# Altium footprint library ADNB95C.PcbLib: 249 footprints (part 12 of 16)
Each footprint in its own frame and in the unit in brackets; x right, y up, seen from the top. Pads: shape width x height; smd on the part's side, far side on the other; paste and mask are expansions set on the pad; w line width, h text height; cw(c..) or ccw(c..) is an arc to the next point about the centre after c.
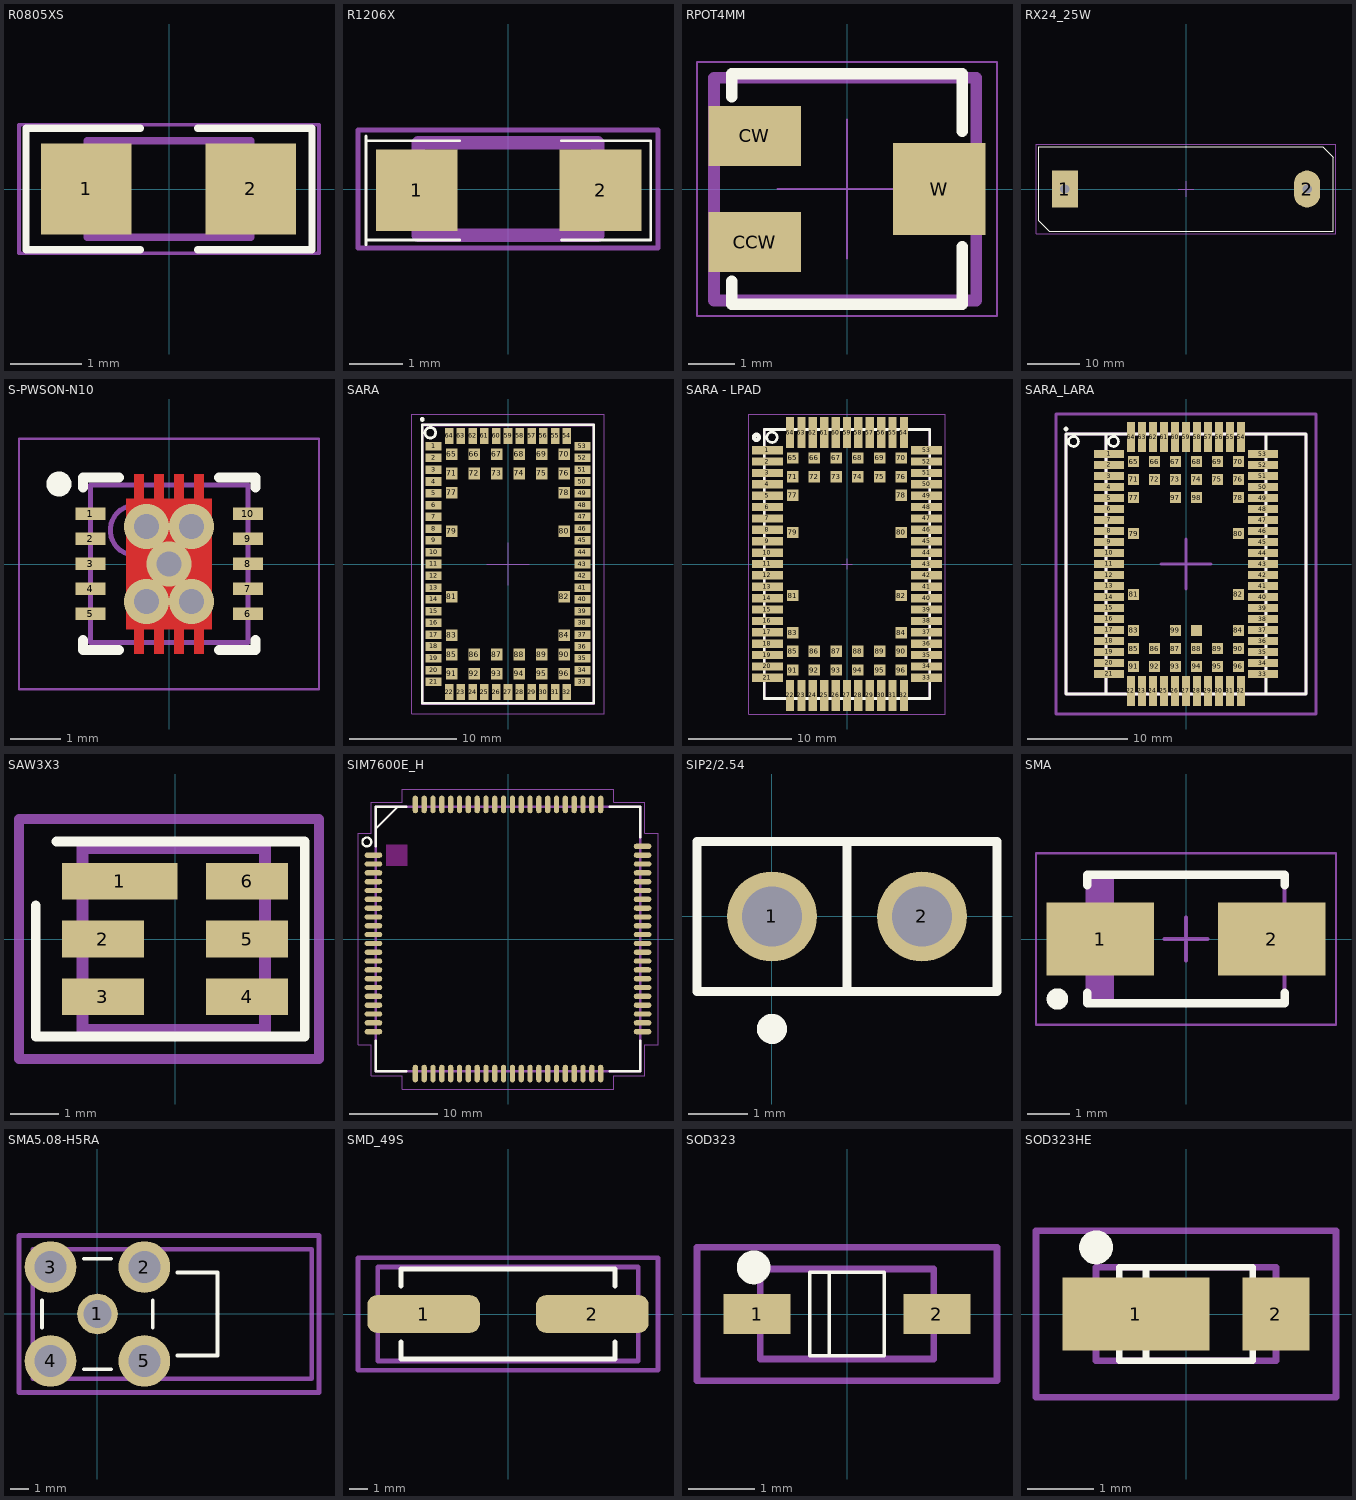
[diagram p11: the footprints below, top view; thin cyan lines are the x and y axes]

## R0805XS [mil] "Chip Resistor;"
height 23.62
pads (2):
  rect 50x50 smd: 1(-45.55,0) 2(45,0)
Top Overlay:
  lines w3.94: -15.75,-33.47 -78.74,-33.47 -78.74,33.46 -15.75,33.46 ; 15.75,-33.47 78.74,-33.47 78.74,33.46 15.75,33.46
Top Designator (Mech7):
  text ".Designator" at -149.95,-10 h30
Top Assembly:
  lines w3.94: -45.28,-26.58 45.28,-26.58 45.28,26.58 -45.28,26.58 -45.28,-26.58
Top Courtyard:
  lines w1.97: -82.68,-35.43 82.68,-35.43 82.68,35.43 -82.68,35.43 -82.68,-35.43
3D body "User Library-RES_2013-0805.STEP": height 29.92, standoff 0, extent -45.28,-26.58 45.27,26.57

## R1206X [mil] "Chip Resistor;"
height 23.62
pads (2):
  rect 60x60 smd: 1(-67,-1) 2(68,-1)
Top Overlay:
  lines w2: -104.33,-41 -104.33,39 ; -104.33,-37.4 -35.43,-37.4 ; -104.33,35.44 -35.43,35.44 ; 39.37,-37.4 105,-37.4 105,35.44 39.37,35.44
Top Designator (Mech7):
  text ".Designator" at -299.9,-19.99 h60
Top Assembly:
  lines w10: -65.94,-34.05 -65.94,34.06 65.95,34.06 65.95,-34.05 -65.94,-34.05
Top Courtyard:
  lines w3.94: -110.24,-43.31 -110.24,43.31 110.24,43.31 110.24,-43.31 -110.24,-43.31
3D body "User Library-RES_3216-1206.STEP": height 33.46, standoff 0, extent -65.94,-34.05 65.95,34.06

## RPOT4MM [mm] "Square Trimming Potentiometer"
height 6
pads (3):
  rect 2x1.3 smd: CCW(-2,-1.15) CW(-2,1.15)
  rect 2x2 smd: W(2,0)
Top Overlay:
  lines w0.254: -2.5,-2 -2.5,-2.5 2.5,-2.5 2.5,-1.25 ; -2.5,2 -2.5,2.5 2.5,2.5 2.5,1.25
Top Designator (Mech7):
  text ".Designator" at -6.094,-0.406 h1.22
Top Assembly:
  lines w0.254: -2.881,-2.418 2.803,-2.418 2.803,2.408 -2.881,2.408 -2.881,-2.418
Top Courtyard:
  lines w0.05: -1.5,0 1.5,0 ; 0,-1.5 0,1.5 ; -3.25,-2.75 -3.25,2.75 3.25,2.75 3.25,-2.75 -3.25,-2.75
3D body "3224x-1-103e.stp": height 5.3, standoff 0.01, extent -2.881,-2.418 2.803,2.408

## RX24_25W [mm] "RX24 25W Power Resistor"
pads (2):
  rect 5x7 hole 1.8: 1(-23,0)
  oval 5x7 hole 1.8: 2(23,0)
Top Overlay:
  lines w0.15: -28,-6 -26,-8 28,-8 28,6 26,8 -28,8 -28,-6
Top Designator (Mech7):
  text ".Designator" at -7.618,-0.508 h1.52
Top Courtyard:
  lines w0.2: -1.5,0 1.5,0 ; 0,-1.5 0,1.5 ; -28.5,-8.5 28.5,-8.5 28.5,8.5 -28.5,8.5 -28.5,-8.5

## S-PWSON-N10 [mm] "QFN, 10-Leads, Body 3.00x3.00mm, Pitch 0.50mm, Thermal Pad 1.70x2.15mm, IPC Medium Density"
height 0.8
pads (11):
  round 0.025 smd: 0(0,0)
  rect 0.6x0.25 smd mask+0.076: 1(-1.575,1) 2(-1.575,0.5) 3(-1.575,0) 4(-1.575,-0.5) 5(-1.575,-1) 6(1.575,-1) 7(1.575,-0.5) 8(1.575,0) 9(1.575,0.5) 10(1.575,1)
via 0,0 diameter 0.9 hole 0.508
via -0.45,-0.75 diameter 0.9 hole 0.508
via 0.45,-0.75 diameter 0.9 hole 0.508
via 0.45,0.75 diameter 0.9 hole 0.508
via -0.45,0.75 diameter 0.9 hole 0.508
Top Layer:
  region: 0.302,1.8 0.098,1.8 0.098,1.2 0.302,1.2
  region: 0.702,1.8 0.498,1.8 0.498,1.2 0.702,1.2
  rectangle: -0.302,1.2 -0.098,1.8
  rectangle: -0.702,1.2 -0.498,1.8
  rectangle: -0.302,-1.8 -0.098,-1.2
  rectangle: -0.702,-1.8 -0.498,-1.2
  region: 0.302,-1.2 0.098,-1.2 0.098,-1.8 0.302,-1.8
  region: 0.702,-1.2 0.498,-1.2 0.498,-1.8 0.702,-1.8
  region: -0.85,-1.3 -0.85,1.3 0.85,1.3 0.85,-1.3
Top Overlay:
  circle w0.25: c-2.2,1.6 r0.125
  lines w0.2: -1.725,-1.525 -1.725,-1.725 -1,-1.725 ; -1.725,1.525 -1.725,1.725 -1,1.725 ; 1,-1.725 1.725,-1.725 1.725,-1.525 ; 1,1.725 1.725,1.725 1.725,1.525
Top Designator (Mech7):
  text ".Designator" at -6.094,-0.406 h1.22
Top Assembly:
  circle w0.1: c-0.675,0.675 r0.5
  lines w0.1: -1.575,-1.575 -1.575,1.575 1.575,1.575 1.575,-1.575 -1.575,-1.575
Top Courtyard:
  lines w0.05: -3,-2.5 -3,2.5 3,2.5 3,-2.5 -3,-2.5
  lines w0.1: -0.5,0 0.5,0 ; 0,-0.5 0,0.5
3D body "S-PWSON-N10.step": height 0.8, standoff 0, extent -1.625,-1.575 1.625,1.575

## SARA [mm] "SARA UBLOX MODULE"
height 2.53
pads (96):
  rect 1.5x0.8 smd: 1(-6.95,11) 2(-6.95,9.9) 3(-6.95,8.8) 4(-6.95,7.7) 5(-6.95,6.6) 6(-6.95,5.5) 7(-6.95,4.4) 8(-6.95,3.3) 9(-6.95,2.2) 10(-6.95,1.1) 11(-6.95,0) 12(-6.95,-1.1) 13(-6.95,-2.2) 14(-6.95,-3.3) 15(-6.95,-4.4) 16(-6.95,-5.5) 17(-6.95,-6.6) 18(-6.95,-7.7) 19(-6.95,-8.8) 20(-6.95,-9.9) 21(-6.95,-11) 33(6.95,-11) 34(6.95,-9.9) 35(6.95,-8.8) 36(6.95,-7.7) 37(6.95,-6.6) 38(6.95,-5.5) 39(6.95,-4.4) 40(6.95,-3.3) 41(6.95,-2.2) 42(6.95,-1.1) 43(6.95,0) 44(6.95,1.1) 45(6.95,2.2) 46(6.95,3.3) 47(6.95,4.4) 48(6.95,5.5) 49(6.95,6.6) 50(6.95,7.7) 51(6.95,8.8) 52(6.95,9.9) 53(6.95,11)
  rect 0.8x1.5 smd: 22(-5.5,-11.95) 23(-4.4,-11.95) 24(-3.3,-11.95) 25(-2.2,-11.95) 26(-1.1,-11.95) 27(0,-11.95) 28(1.1,-11.95) 29(2.2,-11.95) 30(3.3,-11.95) 31(4.4,-11.95) 32(5.5,-11.95) 54(5.5,11.95) 55(4.4,11.95) 56(3.3,11.95) 57(2.2,11.95) 58(1.1,11.95) 59(0,11.95) 60(-1.1,11.95) 61(-2.2,11.95) 62(-3.3,11.95) 63(-4.4,11.95) 64(-5.5,11.95)
  rect 1.1x1.1 smd: 65(-5.25,10.25) 66(-3.15,10.25) 67(-1.05,10.25) 68(1.05,10.25) 69(3.15,10.25) 70(5.25,10.25) 71(-5.25,8.45) 72(-3.15,8.45) 73(-1.05,8.45) 74(1.05,8.45) 75(3.15,8.45) 76(5.25,8.45) 77(-5.25,6.65) 78(5.25,6.65) 79(-5.25,3.05) 80(5.25,3.05) 81(-5.25,-3.05) 82(5.25,-3.05) 83(-5.25,-6.65) 84(5.25,-6.65) 85(-5.25,-8.45) 86(-3.15,-8.45) 87(-1.05,-8.45) 88(1.05,-8.45) 89(3.15,-8.45) 90(5.25,-8.45) 91(-5.25,-10.25) 92(-3.15,-10.25) 93(-1.05,-10.25) 94(1.05,-10.25) 95(3.15,-10.25) 96(5.25,-10.25)
Top Overlay:
  circle w0.254: c-8,13.5 r0.1
  circle w0.254: c-7.25,12.25 r0.5
  lines w0.254: -8,-13 -8,13 8,13 8,-13 -8,-13
Top Designator (Mech7):
  text ".Designator" at -7.618,-0.508 h1.52
Top Assembly:
  lines w0.254: -8.008,-13.019 7.992,-13.019 7.992,12.981 -8.008,12.981 -8.008,-13.019
Top Courtyard:
  lines w0.05: -2,0 2,0 ; 0,-2 0,2 ; -9,-14 9,-14 9,14 -9,14 -9,-14
3D body "SARA.STEP": height 2.96, standoff -0.04, extent -8.008,-13.019 7.992,12.981

## SARA - LPAD [mm] "SARA UBLOX MODULE"
height 2.53
pads (96):
  rect 3x0.8 smd paste-0.025 mask+0.076: 1(-7.7,11) 2(-7.7,9.9) 3(-7.7,8.8) 4(-7.7,7.7) 5(-7.7,6.6) 6(-7.7,5.5) 7(-7.7,4.4) 8(-7.7,3.3) 9(-7.7,2.2) 10(-7.7,1.1) 11(-7.7,0) 12(-7.7,-1.1) 13(-7.7,-2.2) 14(-7.7,-3.3) 15(-7.7,-4.4) 16(-7.7,-5.5) 17(-7.7,-6.6) 18(-7.7,-7.7) 19(-7.7,-8.8) 20(-7.7,-9.9) 21(-7.7,-11) 33(7.7,-11) 34(7.7,-9.9) 35(7.7,-8.8) 36(7.7,-7.7) 37(7.7,-6.6) 38(7.7,-5.5) 39(7.7,-4.4) 40(7.7,-3.3) 41(7.7,-2.2) 42(7.7,-1.1) 43(7.7,0) 44(7.7,1.1) 45(7.7,2.2) 46(7.7,3.3) 47(7.7,4.4) 48(7.7,5.5) 49(7.7,6.6) 50(7.7,7.7) 51(7.7,8.8) 52(7.7,9.9) 53(7.7,11)
  rect 0.8x3 smd paste-0.025 mask+0.076: 22(-5.5,-12.7) 23(-4.4,-12.7) 24(-3.3,-12.7) 25(-2.2,-12.7) 26(-1.1,-12.7) 27(0,-12.7) 28(1.1,-12.7) 29(2.2,-12.7) 30(3.3,-12.7) 31(4.4,-12.7) 32(5.5,-12.7) 54(5.5,12.7) 55(4.4,12.7) 56(3.3,12.7) 57(2.2,12.7) 58(1.1,12.7) 59(0,12.7) 60(-1.1,12.7) 61(-2.2,12.7) 62(-3.3,12.7) 63(-4.4,12.7) 64(-5.5,12.7)
  rect 1.1x1.1 smd paste-0.025 mask+0.076: 65(-5.25,10.25) 66(-3.15,10.25) 67(-1.05,10.25) 68(1.05,10.25) 69(3.15,10.25) 70(5.25,10.25) 71(-5.25,8.45) 72(-3.15,8.45) 73(-1.05,8.45) 74(1.05,8.45) 75(3.15,8.45) 76(5.25,8.45) 77(-5.25,6.65) 78(5.25,6.65) 79(-5.25,3.05) 80(5.25,3.05) 81(-5.25,-3.05) 82(5.25,-3.05) 83(-5.25,-6.65) 84(5.25,-6.65) 85(-5.25,-8.45) 86(-3.15,-8.45) 87(-1.05,-8.45) 88(1.05,-8.45) 89(3.15,-8.45) 90(5.25,-8.45) 91(-5.25,-10.25) 92(-3.15,-10.25) 93(-1.05,-10.25) 94(1.05,-10.25) 95(3.15,-10.25) 96(5.25,-10.25)
Top Overlay:
  circle w0.381: c-8.75,12.25 r0.254
  circle w0.254: c-7.25,12.25 r0.5
  lines w0.254: -8,-13 -8,13 8,13 8,-13 -8,-13
Top Designator (Mech7):
  text ".Designator" at -7.618,-0.508 h1.52
Top Assembly:
  lines w0.254: -8,-13.019 -8,12.973 ; -8,13 7.973,13 7.992,12.981 7.992,-13.011 -7.992,-13.011
Top Courtyard:
  lines w0.1: -0.5,0 0.5,0 ; 0,-0.5 0,0.5 ; -9.5,-14.5 -9.5,14.5 9.5,14.5 9.5,-14.5 -9.5,-14.5
3D body "SARA.STEP": height 2.96, standoff -0.04, extent -8.008,-13.019 7.992,12.981

## SARA_LARA [mm] "SARA UBLOX MODULE"
height 2.53
pads (100):
  rect 3x0.8 smd: 1(-7.7,11) 2(-7.7,9.9) 3(-7.7,8.8) 4(-7.7,7.7) 5(-7.7,6.6) 6(-7.7,5.5) 7(-7.7,4.4) 8(-7.7,3.3) 9(-7.7,2.2) 10(-7.7,1.1) 11(-7.7,0) 12(-7.7,-1.1) 13(-7.7,-2.2) 14(-7.7,-3.3) 15(-7.7,-4.4) 16(-7.7,-5.5) 17(-7.7,-6.6) 18(-7.7,-7.7) 19(-7.7,-8.8) 20(-7.7,-9.9) 21(-7.7,-11) 33(7.7,-11) 34(7.7,-9.9) 35(7.7,-8.8) 36(7.7,-7.7) 37(7.7,-6.6) 38(7.7,-5.5) 39(7.7,-4.4) 40(7.7,-3.3) 41(7.7,-2.2) 42(7.7,-1.1) 43(7.7,0) 44(7.7,1.1) 45(7.7,2.2) 46(7.7,3.3) 47(7.7,4.4) 48(7.7,5.5) 49(7.7,6.6) 50(7.7,7.7) 51(7.7,8.8) 52(7.7,9.9) 53(7.7,11)
  rect 0.8x3 smd: 22(-5.5,-12.7) 23(-4.4,-12.7) 24(-3.3,-12.7) 25(-2.2,-12.7) 26(-1.1,-12.7) 27(0,-12.7) 28(1.1,-12.7) 29(2.2,-12.7) 30(3.3,-12.7) 31(4.4,-12.7) 32(5.5,-12.7) 54(5.5,12.7) 55(4.4,12.7) 56(3.3,12.7) 57(2.2,12.7) 58(1.1,12.7) 59(0,12.7) 60(-1.1,12.7) 61(-2.2,12.7) 62(-3.3,12.7) 63(-4.4,12.7) 64(-5.5,12.7)
  rect 1.1x1.1 smd: 65(-5.25,10.25) 66(-3.15,10.25) 67(-1.05,10.25) 68(1.05,10.25) 69(3.15,10.25) 70(5.25,10.25) 71(-5.25,8.45) 72(-3.15,8.45) 73(-1.05,8.45) 74(1.05,8.45) 75(3.15,8.45) 76(5.25,8.45) 77(-5.25,6.65) 78(5.25,6.65) 79(-5.25,3.05) 80(5.25,3.05) 81(-5.25,-3.05) 82(5.25,-3.05) 83(-5.25,-6.65) 84(5.25,-6.65) 85(-5.25,-8.45) 86(-3.15,-8.45) 87(-1.05,-8.45) 88(1.05,-8.45) 89(3.15,-8.45) 90(5.25,-8.45) 91(-5.25,-10.25) 92(-3.15,-10.25) 93(-1.05,-10.25) 94(1.05,-10.25) 95(3.15,-10.25) 96(5.25,-10.25) 97(-1.05,6.65) 98(1.05,6.65) 99(-1.05,-6.65) 100(1.05,-6.65)
Top Overlay:
  circle w0.254: c-11.25,12.25 r0.5
  circle w0.254: c-7.25,12.25 r0.5
  circle w0.254: c-12,13.5 r0.1
  lines w0.254: -8,-13 -12,-13 -12,13 -8,13 ; -8,-13 -8,13 ; -8,-13 8,-13 ; -8,13 8,13 ; 8,-13 12,-13 12,13 8,13 ; 8,-13 8,13
Top Designator (Mech7):
  text ".Designator" at -7.618,-0.508 h1.52
Top Assembly:
  lines w0.254: -8,-13 -8,12.992 ; 7.992,-13 7.992,13 ; -12,-13 12,-13 12,13 -12,13 -12,-13
Top Courtyard:
  lines w0.254: -2.5,0 2.5,0 ; 0,-2.5 0,2.5 ; -13,-15 13,-15 13,15 -13,15 -13,-15
3D body "SARA.STEP": height 2.96, standoff -0.04, extent -8.008,-13 7.992,13

## SAW3X3 [mm] "SAW Filter 3*3*1 mm 6-pins"
height 1
pads (6):
  rect 2.4x0.762 smd: 1(-1.15,1.2)
  rect 1.7x0.762 smd: 2(-1.5,0) 3(-1.5,-1.2) 4(1.5,-1.2) 5(1.5,0) 6(1.5,1.2)
Top Overlay:
  lines w0.2: -2.9,0.7 -2.9,-2.032 2.7,-2.032 2.7,2.032 -2.468,2.032
Top Designator (Mech7):
  text ".Designator" at -7.743,-0.508 h1.52
Top Assembly:
  lines w0.254: -1.925,-1.9 -1.925,1.9 1.875,1.9 1.875,-1.9 -1.925,-1.9
Top Courtyard:
  lines w0.2: -3.25,-2.5 3,-2.5 3,2.5 -3.25,2.5 -3.25,-2.5
3D body "User Library-QCC8B.STEP": height 1.52, standoff -0.09, extent -1.925,-1.9 1.875,1.9

## SIM7600E_H [mm] "LCC Package 87pin"
pads (87):
  oval 2x0.6 smd: 1(-15.25,9.5) 2(-15.25,8.5) 3(-15.25,7.5) 4(-15.25,6.5) 5(-15.25,5.5) 6(-15.25,4.5) 7(-15.25,3.5) 8(-15.25,2.5) 9(-15.25,1.5) 10(-15.25,0.5) 11(-15.25,-0.5) 12(-15.25,-1.5) 13(-15.25,-2.5) 14(-15.25,-3.5) 15(-15.25,-4.5) 16(-15.25,-5.5) 17(-15.25,-6.5) 18(-15.25,-7.5) 19(-15.25,-8.5) 20(-15.25,-9.5) 41(15.25,-9.5) 42(15.25,-8.5) 43(15.25,-7.5) 44(15.25,-6.5) 45(15.25,-5.5) 46(15.25,-4.5) 47(15.25,-3.5) 48(15.25,-2.5) 49(15.25,-1.5) 50(15.25,-0.5) 51(15.25,0.5) 52(15.25,1.5) 53(15.25,2.5) 54(15.25,3.5) 55(15.25,4.5) 56(15.25,5.5) 57(15.25,6.5) 58(15.25,7.5) 59(15.25,8.5) 60(15.25,9.5) 81(-15.25,-10.5) 82(15.25,-10.5) 85(15.25,10.5)
  oval 0.6x2 smd: 21(-9.5,-15.25) 22(-8.5,-15.25) 23(-7.5,-15.25) 24(-6.5,-15.25) 25(-5.5,-15.25) 26(-4.5,-15.25) 27(-3.5,-15.25) 28(-2.5,-15.25) 29(-1.5,-15.25) 30(-0.5,-15.25) 31(0.5,-15.25) 32(1.5,-15.25) 33(2.5,-15.25) 34(3.5,-15.25) 35(4.5,-15.25) 36(5.5,-15.25) 37(6.5,-15.25) 38(7.5,-15.25) 39(8.5,-15.25) 40(9.5,-15.25) 61(9.5,15.25) 62(8.5,15.25) 63(7.5,15.25) 64(6.5,15.25) 65(5.5,15.25) 66(4.5,15.25) 67(3.5,15.25) 68(2.5,15.25) 69(1.5,15.25) 70(0.5,15.25) 71(-0.5,15.25) 72(-1.5,15.25) 73(-2.5,15.25) 74(-3.5,15.25) 75(-4.5,15.25) 76(-5.5,15.25) 77(-6.5,15.25) 78(-7.5,15.25) 79(-8.5,15.25) 80(-9.5,15.25) 83(10.5,-15.25) 84(-10.5,-15.25) 86(-10.5,15.25) 87(10.5,15.25)
Top Layer keep-out:
  rectangle: -13.8,8.3 -11.4,10.7
Top Overlay:
  circle w0.254: c-16,11 r0.5
  lines w0.254: -15,-11.5 -15,-15 -11.5,-15 ; -15,10.5 -15,15 -11.5,15 ; -15,12.5 -12.5,15 ; 11.5,-15 15,-15 15,-11.5 ; 11.5,15 15,15 15,11.5
Top Designator (Mech7):
  text ".Designator" at -7.618,-0.508 h1.52
Top Assembly:
  lines w0.254: -15,12.5 -12.5,15 ; -15,-15 15,-15 15,15 -15,15 -15,-15
Top Courtyard:
  lines w0.1: -17,-12 -17,12 -15.5,12 -15.5,15.5 -12,15.5 -12,17 12,17 12,15.5 15.5,15.5 15.5,12 17,12 17,-12 15.5,-12 15.5,-15.5 12,-15.5 12,-17 -12,-17 -12,-15.5 -15.5,-15.5 -15.5,-12 -17,-12
3D body "User Library-User Library-SIM7600C.STEP": height 3.19, standoff 0.01, extent -15,-15 15,15

## SIP2/2.54 [mil]
height 78.74
pads (2):
  round 60 hole 40: 1(0,0) 2(100,0)
Top Overlay:
  circle w10: c0.08,-75 r5.08
  lines w6: 50.04,-50.04 50.04,49.96 ; -49.96,-50.04 -49.96,49.96 150.04,49.96 150.04,-50.04 -49.96,-50.04

## SMA [mm] "DO-214AC Molded Diode, 2-Leads, Body 4.30x2.60mm, IPC Medium Density"
height 2.4
pads (2):
  rect 2.5x1.7 smd: 1(-2,0) 2(2,0)
Top Overlay:
  circle w0.25: c-3,-1.4 r0.125
  lines w0.2: -2.3,-1.25 -2.3,-1.5 2.3,-1.5 2.3,-1.25 ; -2.3,1.25 -2.3,1.5 2.3,1.5 2.3,1.25
Top Designator (Mech7):
  text ".Designator" at -7.618,-0.508 h1.52
Top Assembly:
  region: -1.681,1.46 -2.3,1.46 -2.3,-1.46 -1.681,-1.46
  lines w0.1: -2.3,-1.46 2.3,-1.46 2.3,1.46 -2.3,1.46 -2.3,-1.46
Top Courtyard:
  lines w0.05: -3.5,-2 3.5,-2 3.5,2 -3.5,2 -3.5,-2
  lines w0.1: -0.5,0 0.5,0 ; 0,-0.5 0,0.5
3D body "User Library-DO-214AC SMA.STEP": height 2.42, standoff 0.01, extent -2.6,-1.3 2.6,1.3

## SMA5.08-H5RA [mm] "Connector; RF Coaxial, SMA, Thru-Hole; 5 Position; Right-Angle"
height 10
pads (5):
  round 2.2 hole 1.524: 1(0,0)
  round 2.8 hole 1.727: 2(2.54,2.54) 3(-2.54,2.54) 4(-2.54,-2.54) 5(2.54,-2.54)
Top Overlay:
  lines w0.2: -3,-0.74 -3,0.74 ; -0.74,-3 0.74,-3 ; -0.74,3 0.74,3 ; 3,-0.74 3,0.74 ; 4.34,-2.25 6.5,-2.25 6.5,2.25 4.34,2.25
Top Designator (Mech7):
  text ".Designator" at -3.618,-0.508 h1.52
Top Assembly:
  lines w0.254: -3.5,-3.5 11.6,-3.5 11.6,3.5 -3.5,3.5 -3.5,-3.5
Top Courtyard:
  lines w0.254: -4.25,-4.25 12,-4.25 12,4.25 -4.25,4.25 -4.25,-4.25
3D body "User Library-901-143-6RFX.STEP": height 9.86, standoff -3.94, extent -3.5,-3.5 11.6,3.5

## SMD_49S [mm] "Footprint xtal"
pads (2):
  rrect50% 6x2 smd: 1(-4.5,0) 2(4.5,0)
Top Overlay:
  lines w0.254: -5.7,-1.5 -5.7,-2.4 5.7,-2.4 5.7,-1.5 ; -5.7,1.5 -5.7,2.4 5.7,2.4 5.7,1.5
Top Designator (Mech7):
  text ".Designator" at -7.618,-0.508 h1.52
Top Assembly:
  lines w0.254: -6.95,-2.5 6.95,-2.5 6.95,2.5 -6.95,2.5 -6.95,-2.5
Top Courtyard:
  lines w0.254: -8,-3 -8,3 8,3 8,-3 -8,-3
3D body "User Library-HC49_Crystal_SM.STEP": height 4.52, standoff 0.01, extent -6.95,-2.5 6.95,2.5

## SOD323 [mm]
height 16
pads (2):
  rect 1x0.6 smd: 1(-1.35,0) 2(1.35,0)
Top Overlay:
  circle w0.254: c-1.4,0.7 r0.127
  lines w0.05: -0.266,-0.625 -0.266,0.625 ; -0.559,-0.625 0.559,-0.625 0.559,0.625 -0.559,0.625 -0.559,-0.625
Top Designator (Mech7):
  text ".Designator" at -3.809,-0.254 h0.76
Top Assembly:
  lines w0.1: -1.3,-0.675 1.3,-0.675 1.3,0.675 -1.3,0.675 -1.3,-0.675
Top Courtyard:
  lines w0.1: -2.25,-1 2.25,-1 2.25,1 -2.25,1 -2.25,-1
3D body "User Library-SOD323-1.STEP": height 1.1, standoff 0, extent -1.3,-0.675 1.3,0.675

## SOD323HE [mm]
pads (2):
  rect 2.2x1.1 smd: 1(-0.75,0)
  rect 1x1.1 smd: 2(1.35,0)
Top Overlay:
  circle w0.254: c-1.35,1 r0.127
  lines w0.1: -0.6,-0.7 -0.6,0.7 ; -1,-0.7 -1,0.7 1,0.7 1,-0.7 -1,-0.7
Top Designator (Mech7):
  text ".Designator" at -3.809,-0.254 h0.76
Top Assembly:
  lines w0.1: -1.35,-0.7 1.35,-0.7 1.35,0.7 -1.35,0.7 -1.35,-0.7
Top Courtyard:
  lines w0.1: -2.25,-1.25 2.25,-1.25 2.25,1.25 -2.25,1.25 -2.25,-1.25
3D body "User Library-SOD-323HE.STEP": height 0.75, standoff -0.03, extent -1.35,-0.7 1.35,0.7